# Altium footprint library 逸芬的库鸭.PcbLib: 255 footprints (part 12 of 20)
Each footprint in its own frame and in the unit in brackets; x right, y up, seen from the top. Pads: shape width x height; smd on the part's side, far side on the other; paste and mask are expansions set on the pad; w line width, h text height; cw(c..) or ccw(c..) is an arc to the next point about the centre after c.
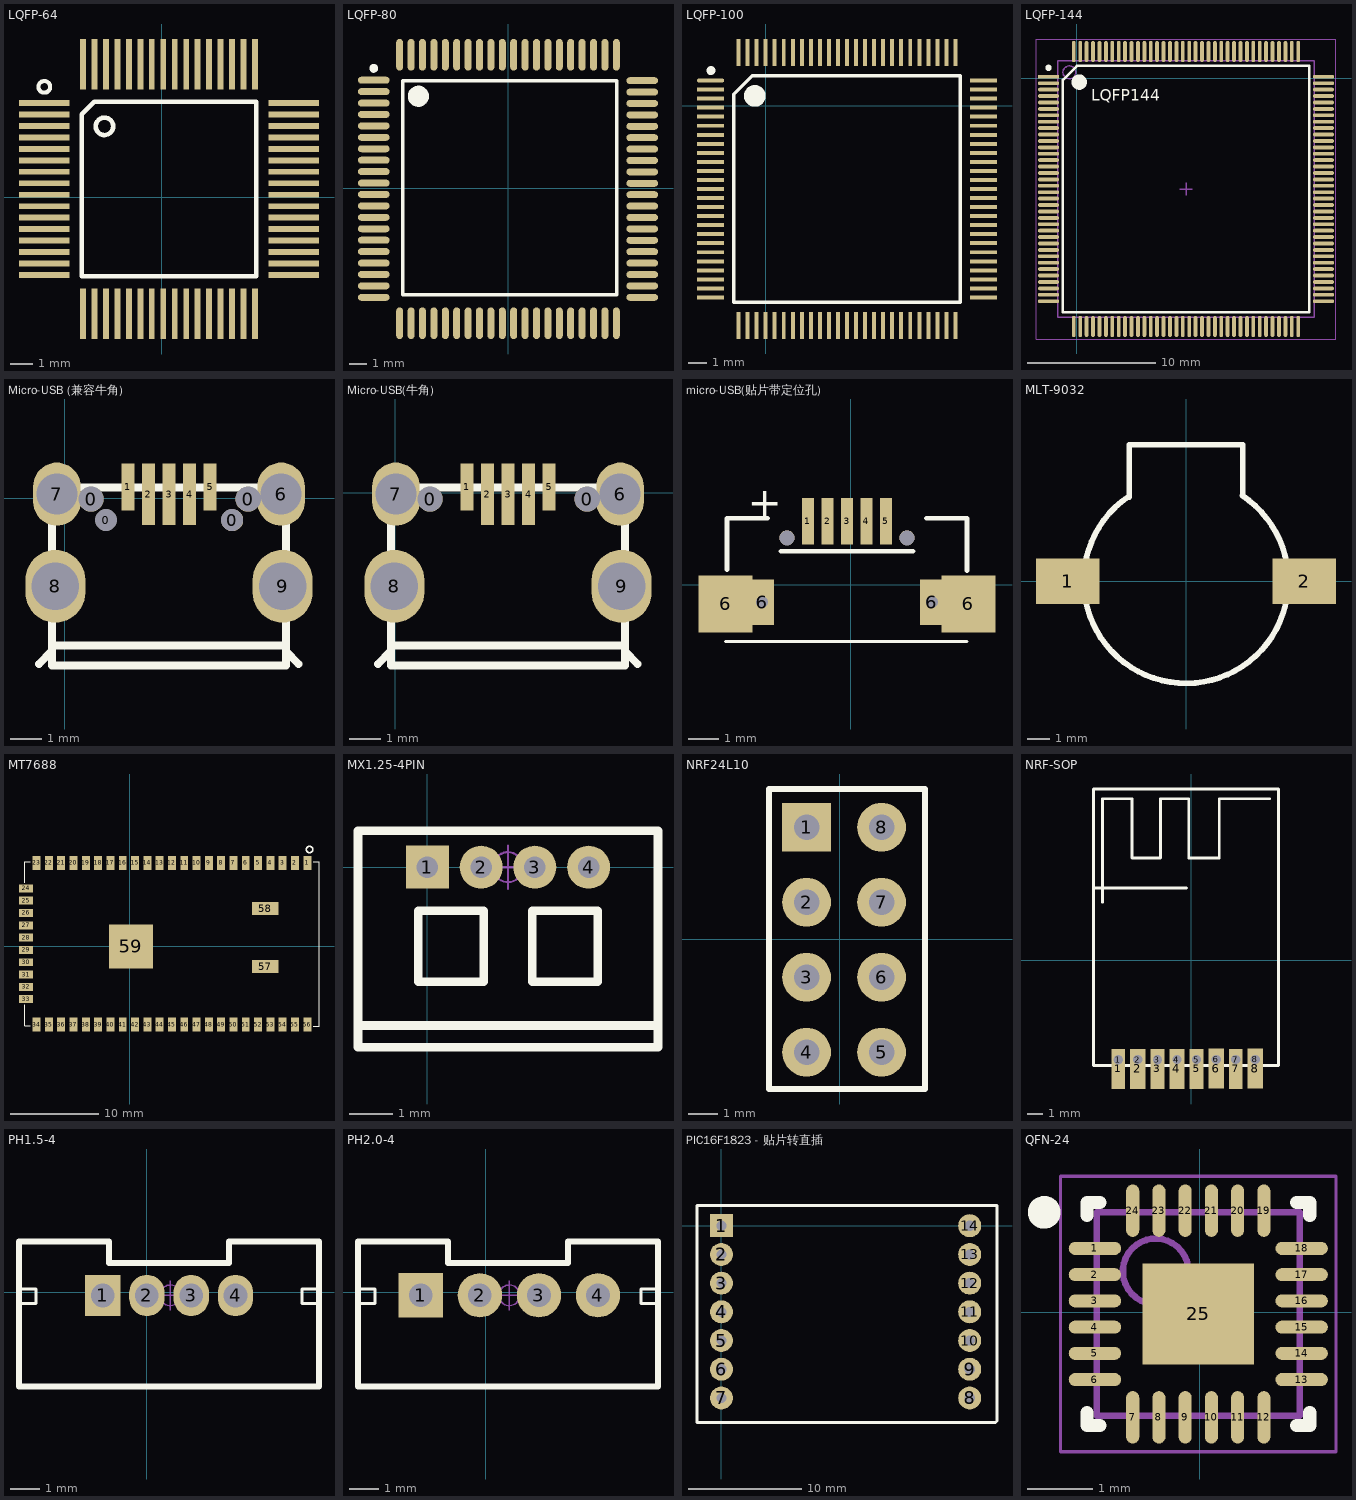
[diagram p11: the footprints below, top view; thin cyan lines are the x and y axes]

## LQFP-64 [mil]
pads (64):
  rect 86.61x10 smd: 1(-202,162) 2(-202,142.31) 3(-202,122.63) 4(-202,102.94) 5(-202,83.26) 6(-202,63.58) 7(-202,43.89) 8(-202,24.21) 9(-202,4.52) 10(-202,-15.17) 11(-202,-34.85) 12(-202,-54.54) 13(-202,-74.22) 14(-202,-93.91) 15(-202,-113.59) 16(-202,-133.27) 33(227.13,-133.27) 34(227.13,-113.59) 35(227.13,-93.9) 36(227.13,-74.22) 37(227.13,-54.54) 38(227.13,-34.85) 39(227.13,-15.17) 40(227.13,4.52) 41(227.13,24.21) 42(227.13,43.89) 43(227.13,63.58) 44(227.13,83.26) 45(227.13,102.95) 46(227.13,122.63) 47(227.13,142.31) 48(227.13,162)
  rect 10x86.61 smd: 17(-135.07,-200.2) 18(-115.39,-200.2) 19(-95.7,-200.21) 20(-76.02,-200.2) 21(-56.33,-200.2) 22(-36.65,-200.2) 23(-16.96,-200.21) 24(2.72,-200.2) 25(22.41,-200.2) 26(42.09,-200.21) 27(61.78,-200.2) 28(81.46,-200.2) 29(101.15,-200.21) 30(120.83,-200.2) 31(140.52,-200.2) 32(160.21,-200.2) 49(160.2,228.93) 50(140.52,228.93) 51(120.83,228.93) 52(101.15,228.93) 53(81.46,228.93) 54(61.78,228.93) 55(42.09,228.93) 56(22.41,228.93) 57(2.72,228.93) 58(-16.96,228.93) 59(-36.65,228.93) 60(-56.33,228.93) 61(-76.02,228.93) 62(-95.7,228.93) 63(-115.39,228.93) 64(-135.07,228.93)
Top Overlay:
  circle w7: c-201.77,189.96 r10
  circle w7.87: c-98.43,122.05 r15
  lines w7.87: -137.63,-135.83 -137.63,142.88 -115.95,164.56 162.76,164.56 162.76,-135.83 -137.63,-135.83
3D body "User Library-LQFP-64-1.STEP": height 59.06, standoff 0, extent -224.66,-221.22 247.78,251.22

## LQFP-80 [mm]
pads (80):
  oval 1.8x0.4 smd: 1(-7.66,6.149) 2(-7.66,5.497) 3(-7.66,4.846) 4(-7.66,4.195) 5(-7.66,3.543) 6(-7.66,2.892) 7(-7.66,2.24) 8(-7.66,1.589) 9(-7.66,0.937) 10(-7.66,0.286) 11(-7.66,-0.365) 12(-7.66,-1.017) 13(-7.66,-1.668) 14(-7.66,-2.32) 15(-7.66,-2.971) 16(-7.66,-3.623) 17(-7.66,-4.274) 18(-7.66,-4.925) 19(-7.66,-5.577) 20(-7.66,-6.228) 41(7.64,-6.228) 42(7.64,-5.578) 43(7.64,-4.928) 44(7.64,-4.278) 45(7.64,-3.628) 46(7.64,-2.978) 47(7.64,-2.328) 48(7.64,-1.678) 49(7.64,-1.028) 50(7.64,-0.378) 51(7.64,0.272) 52(7.64,0.922) 53(7.64,1.572) 54(7.64,2.222) 55(7.64,2.872) 56(7.64,3.522) 57(7.64,4.172) 58(7.64,4.822) 59(7.64,5.472) 60(7.64,6.122)
  oval 0.4x1.8 smd: 21(-6.185,-7.703) 22(-5.535,-7.703) 23(-4.885,-7.703) 24(-4.235,-7.703) 25(-3.585,-7.703) 26(-2.935,-7.703) 27(-2.285,-7.703) 28(-1.635,-7.703) 29(-0.985,-7.703) 30(-0.335,-7.703) 31(0.315,-7.703) 32(0.965,-7.703) 33(1.615,-7.703) 34(2.265,-7.703) 35(2.915,-7.703) 36(3.565,-7.703) 37(4.215,-7.703) 38(4.865,-7.703) 39(5.515,-7.703) 40(6.165,-7.703) 61(6.165,7.597) 62(5.515,7.597) 63(4.865,7.597) 64(4.215,7.597) 65(3.565,7.597) 66(2.915,7.597) 67(2.265,7.597) 68(1.615,7.597) 69(0.965,7.597) 70(0.315,7.597) 71(-0.335,7.597) 72(-0.985,7.597) 73(-1.635,7.597) 74(-2.285,7.597) 75(-2.935,7.597) 76(-3.585,7.597) 77(-4.235,7.597) 78(-4.885,7.597) 79(-5.535,7.597) 80(-6.185,7.597)
Top Overlay:
  circle w0.6: c-5.12,5.233 r0.3
  circle w0.25: c-7.66,6.822 r0.125
  lines w0.2: -6.009,-6.07 6.183,-6.07 6.183,6.122 -6.009,6.122 -6.009,-6.07
3D body "User Library-QFP50P1400X1400X160-80N.STEP": height 1.6, standoff 0, extent -7.024,-6.828 7.176,7.372

## LQFP-100 [mm]
pads (100):
  oval 1.5x0.22 smd: 1(-3.048,1.397)
  rect 1.5x0.22 smd: 2(-3.048,0.897) 3(-3.048,0.397) 4(-3.048,-0.103) 5(-3.048,-0.603) 6(-3.048,-1.103) 7(-3.048,-1.603) 8(-3.048,-2.103) 9(-3.048,-2.603) 10(-3.048,-3.103) 11(-3.048,-3.603) 12(-3.048,-4.103) 13(-3.048,-4.603) 14(-3.048,-5.103) 15(-3.048,-5.603) 16(-3.048,-6.103) 17(-3.048,-6.603) 18(-3.048,-7.103) 19(-3.048,-7.603) 20(-3.048,-8.103) 21(-3.048,-8.603) 22(-3.048,-9.103) 23(-3.048,-9.603) 24(-3.048,-10.103) 25(-3.048,-10.603) 51(12.05,-10.603) 52(12.05,-10.103) 53(12.05,-9.603) 54(12.05,-9.103) 55(12.05,-8.603) 56(12.05,-8.103) 57(12.05,-7.603) 58(12.05,-7.103) 59(12.05,-6.603) 60(12.05,-6.103) 61(12.05,-5.603) 62(12.05,-5.103) 63(12.05,-4.603) 64(12.05,-4.103) 65(12.05,-3.603) 66(12.05,-3.103) 67(12.05,-2.603) 68(12.05,-2.103) 69(12.05,-1.603) 70(12.05,-1.103) 71(12.05,-0.603) 72(12.05,-0.103) 73(12.05,0.397) 74(12.05,0.897) 75(12.05,1.397)
  rect 0.22x1.5 smd: 26(-1.499,-12.152) 27(-0.999,-12.152) 28(-0.499,-12.152) 29(0.001,-12.152) 30(0.501,-12.152) 31(1.001,-12.152) 32(1.501,-12.152) 33(2.001,-12.152) 34(2.501,-12.152) 35(3.001,-12.152) 36(3.501,-12.152) 37(4.001,-12.152) 38(4.501,-12.152) 39(5.001,-12.152) 40(5.501,-12.152) 41(6.001,-12.152) 42(6.501,-12.152) 43(7.001,-12.152) 44(7.501,-12.152) 45(8.001,-12.152) 46(8.501,-12.152) 47(9.001,-12.152) 48(9.501,-12.152) 49(10.001,-12.152) 50(10.501,-12.152) 76(10.501,2.946) 77(10.001,2.946) 78(9.501,2.946) 79(9.001,2.946) 80(8.501,2.946) 81(8.001,2.946) 82(7.501,2.946) 83(7.001,2.946) 84(6.501,2.946) 85(6.001,2.946) 86(5.501,2.946) 87(5.001,2.946) 88(4.501,2.946) 89(4.001,2.946) 90(3.501,2.946) 91(3.001,2.946) 92(2.501,2.946) 93(2.001,2.946) 94(1.501,2.946) 95(1.001,2.946) 96(0.501,2.946) 97(0.001,2.946) 98(-0.499,2.946) 99(-0.999,2.946) 100(-1.499,2.946)
Top Overlay:
  circle w0.6: c-0.6,0.55 r0.3
  circle w0.25: c-3.025,1.95 r0.125
  lines w0.2: -1.763,-10.867 -1.763,0.637 -0.739,1.661 10.765,1.661 10.765,-10.867 -1.763,-10.867
3D body "User Library-LQFP.STEP": height 1.65, standoff -0.06, extent -3.503,-12.598 12.497,3.402

## LQFP-144 [mm]
pads (144):
  rect 1.651x0.3 smd: 1(-2.199,0.11)
  oval 1.651x0.3 smd: 2(-2.199,-0.39) 3(-2.199,-0.89) 4(-2.199,-1.39) 5(-2.199,-1.89) 6(-2.199,-2.39) 7(-2.199,-2.89) 8(-2.199,-3.39) 9(-2.199,-3.89) 10(-2.199,-4.39) 11(-2.199,-4.89) 12(-2.199,-5.39) 13(-2.199,-5.89) 14(-2.199,-6.39) 15(-2.199,-6.89) 16(-2.199,-7.39) 17(-2.199,-7.89) 18(-2.199,-8.39) 19(-2.199,-8.89) 20(-2.199,-9.39) 21(-2.199,-9.89) 22(-2.199,-10.39) 23(-2.199,-10.89) 24(-2.199,-11.39) 25(-2.199,-11.89) 26(-2.199,-12.39) 27(-2.199,-12.89) 28(-2.199,-13.39) 29(-2.199,-13.89) 30(-2.199,-14.39) 31(-2.199,-14.89) 32(-2.199,-15.39) 33(-2.199,-15.89) 34(-2.199,-16.39) 35(-2.199,-16.89) 36(-2.199,-17.39) 73(19.251,-17.39) 74(19.251,-16.89) 75(19.251,-16.39) 76(19.251,-15.89) 77(19.251,-15.39) 78(19.251,-14.89) 79(19.251,-14.39) 80(19.251,-13.89) 81(19.251,-13.39) 82(19.251,-12.89) 83(19.251,-12.39) 84(19.251,-11.89) 85(19.251,-11.39) 86(19.251,-10.89) 87(19.251,-10.39) 88(19.251,-9.89) 89(19.251,-9.39) 90(19.251,-8.89) 91(19.251,-8.39) 92(19.251,-7.89) 93(19.251,-7.39) 94(19.251,-6.89) 95(19.251,-6.39) 96(19.251,-5.89) 97(19.251,-5.39) 98(19.251,-4.89) 99(19.251,-4.39) 100(19.251,-3.89) 101(19.251,-3.39) 102(19.251,-2.89) 103(19.251,-2.39) 104(19.251,-1.89) 105(19.251,-1.39) 106(19.251,-0.89) 107(19.251,-0.39) 108(19.251,0.11)
  oval 0.3x1.651 smd: 37(-0.224,-19.365) 38(0.276,-19.365) 39(0.776,-19.365) 40(1.276,-19.365) 41(1.776,-19.365) 42(2.276,-19.365) 43(2.776,-19.365) 44(3.276,-19.365) 45(3.776,-19.365) 46(4.276,-19.365) 47(4.776,-19.365) 48(5.276,-19.365) 49(5.776,-19.365) 50(6.276,-19.365) 51(6.776,-19.365) 52(7.276,-19.365) 53(7.776,-19.365) 54(8.276,-19.365) 55(8.776,-19.365) 56(9.276,-19.365) 57(9.776,-19.365) 58(10.276,-19.365) 59(10.776,-19.365) 60(11.276,-19.365) 61(11.776,-19.365) 62(12.276,-19.365) 63(12.776,-19.365) 64(13.276,-19.365) 65(13.776,-19.365) 66(14.276,-19.365) 67(14.776,-19.365) 68(15.276,-19.365) 69(15.776,-19.365) 70(16.276,-19.365) 71(16.776,-19.365) 72(17.276,-19.365) 109(17.276,2.085) 110(16.776,2.085) 111(16.276,2.085) 112(15.776,2.085) 113(15.276,2.085) 114(14.776,2.085) 115(14.276,2.085) 116(13.776,2.085) 117(13.276,2.085) 118(12.776,2.085) 119(12.276,2.085) 120(11.776,2.085) 121(11.276,2.085) 122(10.776,2.085) 123(10.276,2.085) 124(9.776,2.085) 125(9.276,2.085) 126(8.776,2.085) 127(8.276,2.085) 128(7.776,2.085) 129(7.276,2.085) 130(6.776,2.085) 131(6.276,2.085) 132(5.776,2.085) 133(5.276,2.085) 134(4.776,2.085) 135(4.276,2.085) 136(3.776,2.085) 137(3.276,2.085) 138(2.776,2.085) 139(2.276,2.085) 140(1.776,2.085) 141(1.276,2.085) 142(0.776,2.085) 143(0.276,2.085) 144(-0.224,2.085)
Top Overlay:
  circle w0.6: c0.2,-0.3 r0.3
  circle w0.25: c-2.199,0.81 r0.125
  lines w0.2: -1.074,-18.24 -1.074,-0.124 0.01,0.96 18.126,0.96 18.126,-18.24 -1.074,-18.24
  text "LQFP144" at 1.125,-2.05 h1.52
Mechanical 13:
  circle w0.1: c-0.574,0.46 r0.5
  lines w0.1: -1.474,-18.64 18.526,-18.64 18.526,1.36 -1.474,1.36 -1.474,-18.64
Mechanical 15:
  lines w0.05: -3.174,-20.34 20.226,-20.34 20.226,3.06 -3.174,3.06 -3.174,-20.34
  lines w0.1: 8.026,-8.64 9.026,-8.64 ; 8.526,-9.14 8.526,-8.14
3D body "TSQFP50P2200X2200X160-144N.step": height 1.6, standoff 0, extent -2.474,-19.64 19.526,2.36

## Micro-USB (兼容牛角) [mm]
pads (13):
  round 0.8 hole 0.8: 0(0.825,-0.025) 0(5.8,-0.025)
  oval 0.47x0.7 hole 0.7: 0(1.294,-0.69)
  round 0.7 hole 0.7: 0(5.294,-0.69)
  rect 0.4x1.5 smd: 1(1.994,0.359) 5(4.594,0.359)
  rect 0.4x1.95 smd: 2(2.644,0.135) 3(3.294,0.135) 4(3.944,0.135)
  oval 1.5x2 hole 1.3: 6(6.844,0.135) 7(-0.256,0.135)
  oval 1.9x2.3 hole 1.5: 8(-0.306,-2.786) 9(6.894,-2.786)
Top Overlay:
  lines w0.254: -0.83,-5.253 -0.406,-4.83 -0.406,-4.665 ; -0.414,-5.295 -0.406,-5.295 ; 7.4,-5.253 6.994,-4.847 6.994,-4.665 ; -0.406,-5.295 -0.406,-4.665 ; -0.406,-5.295 6.994,-5.295 6.994,-4.665 ; -0.406,-4.665 -0.406,0.335 6.994,0.335 6.994,-4.665 ; -0.406,-4.665 6.994,-4.665
3D body "User Library-MicroUSB-B_Molex_105017-0001.STEP": height 0.23, standoff -3.08, extent -0.776,-5.338 7.424,0.092

## Micro-USB(牛角) [mm]
pads (11):
  round 0.8 hole 0.8: 0(1.1,-0.2) 0(6.075,-0.2)
  rect 0.4x1.5 smd: 1(2.269,0.184) 5(4.869,0.184)
  rect 0.4x1.95 smd: 2(2.919,-0.04) 3(3.569,-0.04) 4(4.219,-0.04)
  oval 1.5x2 hole 1.3: 6(7.119,-0.04) 7(0.019,-0.04)
  oval 1.9x2.3 hole 1.5: 8(-0.031,-2.961) 9(7.169,-2.961)
Top Overlay:
  lines w0.254: -0.555,-5.428 -0.131,-5.005 -0.131,-4.84 ; -0.139,-5.47 -0.131,-5.47 ; 7.675,-5.428 7.269,-5.022 7.269,-4.84 ; -0.131,-5.47 -0.131,-4.84 ; -0.131,-5.47 7.269,-5.47 7.269,-4.84 ; -0.131,-4.84 -0.131,0.16 7.269,0.16 7.269,-4.84 ; -0.131,-4.84 7.269,-4.84
3D body "User Library-MicroUSB-B_Molex_105017-0001.STEP": height 0.23, standoff -3.08, extent -0.501,-5.513 7.699,-0.083

## micro-USB(贴片带定位孔) [mm]
pads (11):
  rect 0.4x1.55 smd: 1(-1.423,2.116) 2(-0.773,2.116) 3(-0.123,2.116) 4(0.527,2.116) 5(1.177,2.116)
  rect 1.8x1.9 smd: 6(-4.173,-0.634) 6(3.927,-0.634)
  rect 0.8x1.5 hole 0.4: 6(-2.948,-0.584) 6(2.702,-0.584)
  round 0.5 hole 0.5 unplated: ""(-2.123,1.566) ""(1.877,1.566)
Top Overlay:
  lines w0.1: -4.173,-1.884 3.877,-1.884
  lines w0.152: -4.123,0.5 -4.123,2.216 -2.773,2.216 ; -2.323,1.116 2.077,1.116 ; 2.527,2.216 3.877,2.216 3.877,0.466
  text "+" at -3.423,2.266 h1
Keep-Out Layer:
  lines w0.127: -3.177,-1.127 -3.177,-0.009 -2.719,-0.009 -2.719,-1.127 -3.177,-1.127 ; 2.473,-1.127 2.931,-1.127 2.931,-0.009 2.473,-0.009 2.473,-1.127
Mechanical 1:
  lines w0.127: -3.177,-1.127 -2.719,-1.127 -2.719,-0.009 -3.177,-0.009 -3.177,-1.127 ; 2.473,-1.127 2.931,-1.127 2.931,-0.009 2.473,-0.009 2.473,-1.127
3D body "MICRO-USB.stp": height 2.47, standoff -0.92, extent -4.075,-2.7 3.875,3.076

## MLT-9032 [mm]
pads (2):
  rect 2.8x2 smd: 1(-5.2,0) 2(5.2,0)
Top Overlay:
  lines w0.254: -2.541,3.714 ccw(c0,0) 2.473,3.759 ; -2.5,3.7 -2.5,6 2.5,6 2.5,3.8
3D body "User Library-CEP2242_Buzzer.STEP": height 7.59, standoff -5.5, extent -6.832,-5.942 6.859,7.749

## MT7688 [mm] "MT7688模组"
pads (59):
  rect 0.9x1.6 smd: 1(20.2,9.49) 2(18.8,9.49) 3(17.4,9.49) 4(16,9.49) 5(14.6,9.49) 6(13.2,9.49) 7(11.8,9.49) 8(10.4,9.49) 9(9,9.49) 10(7.6,9.49) 11(6.2,9.49) 12(4.8,9.49) 13(3.4,9.49) 14(2,9.49) 15(0.6,9.49) 16(-0.8,9.49) 17(-2.2,9.49) 18(-3.6,9.49) 19(-5,9.49) 20(-6.4,9.49) 21(-7.8,9.49) 22(-9.2,9.49) 23(-10.6,9.49) 34(-10.6,-8.91) 35(-9.2,-8.91) 36(-7.8,-8.91) 37(-6.4,-8.91) 38(-5,-8.91) 39(-3.6,-8.91) 40(-2.2,-8.91) 41(-0.8,-8.91) 42(0.6,-8.91) 43(2,-8.91) 44(3.4,-8.91) 45(4.8,-8.91) 46(6.2,-8.91) 47(7.6,-8.91) 48(9,-8.91) 49(10.4,-8.91) 50(11.8,-8.91) 51(13.2,-8.91) 52(14.6,-8.91) 53(16,-8.91) 54(17.4,-8.91) 55(18.8,-8.91) 56(20.2,-8.91)
  rect 1.6x0.9 smd: 24(-11.8,6.59) 25(-11.8,5.19) 26(-11.8,3.79) 27(-11.8,2.39) 28(-11.8,0.99) 29(-11.8,-0.41) 30(-11.8,-1.81) 31(-11.8,-3.21) 32(-11.8,-4.61) 33(-11.8,-6.01)
  rect 3x1.5 smd: 57(15.4,-2.31) 58(15.4,4.29)
  rect 5x5 smd: 59(0.134,-0.01)
Top Overlay:
  circle w0.15: c20.454,11.014 r0.359
  lines w0.1: -11.931,-6.639 -11.931,-9.052 -11.296,-9.052 ; -11.931,7.219 -11.931,9.632 -11.296,9.632 ; 20.896,-9.067 21.531,-9.067 21.531,9.632 20.896,9.632
3D body: height 1, standoff 0, extent -11.95,-9.075 21.525,9.65
3D body "User Library-1909763-1.STEP": height 2, standoff 0.72, extent -11.873,6.65 -9.023,9.65

## MX1.25-4PIN [mm]
pads (4):
  rect 1x1 hole 0.5: 1(0,0)
  round 1 hole 0.5: 2(1.25,0) 3(2.5,0) 4(3.75,0)
Top Overlay:
  lines w0.2: -1.614,-3.683 5.364,-3.683 ; -1.614,-4.191 -1.614,0.85 5.364,0.85 5.364,-4.191 -1.614,-4.191 ; -0.217,-2.667 1.307,-2.667 1.307,-1.016 -0.217,-1.016 -0.217,-2.667 ; 2.443,-2.667 3.967,-2.667 3.967,-1.016 2.443,-1.016 2.443,-2.667
Mechanical 15:
  circle w0.05: c1.875,0 r0.35
  lines w0.05: 1.375,0 2.375,0 ; 1.875,-0.5 1.875,0.5
3D body "MOLEX1.25-WI-4P.STEP": height 3.35, standoff -2.1, extent -1.5,-4.05 5.25,0.85

## NRF24L10 [mil]
pads (8):
  rect 65x65 hole 34: 1(-44,149)
  round 65 hole 34: 2(-44,49) 3(-44,-51) 4(-44,-151) 5(56,-151) 6(56,-51) 7(56,49) 8(56,149)
Top Overlay:
  lines w7.87: -94,-200 113.73,-200 113.73,200 -94,200 -94,-200
3D body "User Library-NRF24L01.STEP": height 374.02, standoff -116.2, extent -1028,-209 113.73,381.56

## NRF-SOP [mm]
pads (16):
  rect 0.9x2.6 smd: 1(-4.724,-7.061) 3(-2.184,-7.061) 5(0.356,-7.052) 7(2.896,-7.052)
  rect 0.725x0.725 / inner rect 0.725x0.762 / far side rect 0.725x0.725 hole 0.6: 1(-4.724,-6.461) 3(-2.184,-6.461) 5(0.356,-6.452) 7(2.896,-6.452)
  rect 1x2.6 smd: 2(-3.454,-7.052) 4(-0.914,-7.052) 6(1.626,-7.042) 8(4.166,-7.042)
  rect 0.725x0.762 / inner rect 0.725x0.762 / far side rect 0.725x0.725 hole 0.6: 2(-3.454,-6.452) 4(-0.914,-6.452) 6(1.626,-6.442) 8(4.166,-6.442)
Top Overlay:
  lines w0.178: -6.325,4.648 -6.299,4.674 -0.305,4.674 ; -5.74,3.759 -5.74,10.465 -3.835,10.465 -3.835,6.629 -2.184,6.629 -1.981,6.629 -1.981,10.465 -0.152,10.465 -0.152,6.629 1.829,6.629 1.829,10.465 5.105,10.465 ; -6.325,-6.833 5.664,-6.833 5.664,11.1 -6.325,11.1 -6.325,-6.833

## PH1.5-4 [mm]
pads (4):
  rect 1.2x1.4 hole 0.8: 1(-1.5,-0.102)
  oval 1.2x1.4 hole 0.8: 2(0,-0.102) 3(1.5,-0.102) 4(3,-0.102)
Top Overlay:
  lines w0.1: -4.333,-0.379 -3.753,-0.379 -3.753,0.121 -4.333,0.121 ; 5.827,-0.379 5.247,-0.379 5.247,0.121 5.827,0.121
  lines w0.2: -4.333,1.721 -4.333,-3.179 5.827,-3.179 5.827,1.721 ; -1.285,1.721 -1.285,1.005 2.779,1.005 2.779,1.721
  lines w0.203: -4.333,1.721 -1.285,1.721 ; 2.779,1.721 5.827,1.721
Mechanical 15:
  circle w0.05: c0.795,-0.095 r0.35
  lines w0.05: 0.295,-0.095 1.295,-0.095 ; 0.795,-0.595 0.795,0.405
3D body "PH2.0-LI-4P.STEP": height 6.01, standoff -2.99, extent -4.155,-3.095 5.746,1.605

## PH2.0-4 [mm]
pads (4):
  rect 1.5x1.5 hole 0.8: 1(-2.205,-0.095)
  round 1.5 hole 0.8: 2(-0.205,-0.095) 3(1.795,-0.095) 4(3.795,-0.095)
Top Overlay:
  lines w0.1: -4.333,-0.379 -3.753,-0.379 -3.753,0.121 -4.333,0.121 ; 5.827,-0.379 5.247,-0.379 5.247,0.121 5.827,0.121
  lines w0.2: -4.333,1.721 -4.333,-3.179 5.827,-3.179 5.827,1.721 ; -1.285,1.721 -1.285,1.005 2.779,1.005 2.779,1.721
  lines w0.203: -4.333,1.721 -1.285,1.721 ; 2.779,1.721 5.827,1.721
Mechanical 15:
  circle w0.05: c0.795,-0.095 r0.35
  lines w0.05: 0.295,-0.095 1.295,-0.095 ; 0.795,-0.595 0.795,0.405
3D body "PH2.0-LI-4P.STEP": height 6.01, standoff -2.99, extent -4.155,-3.095 5.746,1.605

## PIC16F1823 - 贴片转直插 [mil]
pads (14):
  rect 80x80 hole 35.43: 1(0,0)
  round 80 hole 35.43: 2(0,-100) 3(0,-200) 4(0,-300) 5(0,-400) 6(0,-500) 7(0,-600) 8(865,-600) 9(865,-500) 10(865,-400) 11(865,-300) 12(865,-200) 13(865,-100) 14(865,0)
Top Overlay:
  lines w10: -85,-685 955,-685 960,-680 960,70 -85,70 -85,-685
Bottom Overlay:
  lines w7.87: -50,-650 -50,50 50,50 50,-650 -50,-650 ; 815,-650 915,-650 915,50 815,50 815,-650

## QFN-24 [mm]
pads (25):
  oval 0.8x0.2 smd: 1(-1.602,0.975) 2(-1.602,0.575) 3(-1.602,0.175) 4(-1.602,-0.225) 5(-1.602,-0.625) 6(-1.602,-1.025) 13(1.551,-1.025) 14(1.551,-0.625) 15(1.551,-0.225) 16(1.551,0.175) 17(1.551,0.575) 18(1.551,0.975)
  oval 0.2x0.8 smd: 7(-1.025,-1.602) 8(-0.625,-1.602) 9(-0.225,-1.602) 10(0.175,-1.602) 11(0.575,-1.602) 12(0.975,-1.602) 19(0.975,1.551) 20(0.575,1.551) 21(0.175,1.551) 22(-0.225,1.551) 23(-0.625,1.551) 24(-1.025,1.551)
  rect 1.7x1.54 smd: 25(-0.025,-0.025)
Top Overlay:
  circle w0.25: c-2.375,1.525 r0.125
  lines w0.2: -1.725,-1.525 -1.725,-1.725 -1.525,-1.725 ; -1.725,1.475 -1.725,1.675 -1.525,1.675 ; 1.475,-1.725 1.675,-1.725 1.675,-1.525 ; 1.475,1.675 1.675,1.675 1.675,1.475
Mechanical 13:
  circle w0.1: c-0.675,0.625 r0.5
  lines w0.1: -1.575,-1.575 1.525,-1.575 1.525,1.525 -1.575,1.525 -1.575,-1.575
Mechanical 15:
  lines w0.05: -2.125,-2.125 2.075,-2.125 2.075,2.075 -2.125,2.075 -2.125,-2.125
  lines w0.1: -0.525,-0.025 0.475,-0.025 ; -0.025,-0.525 -0.025,0.475
3D body "QFN40P300X300X100_HS-25N.step": height 1, standoff 0, extent -1.595,-1.595 1.545,1.545